# Altium footprint library IDETEC.PcbLib: 275 footprints (part 3 of 18)
Each footprint in its own frame and in the unit in brackets; x right, y up, seen from the top. Pads: shape width x height; smd on the part's side, far side on the other; paste and mask are expansions set on the pad; w line width, h text height; cw(c..) or ccw(c..) is an arc to the next point about the centre after c.
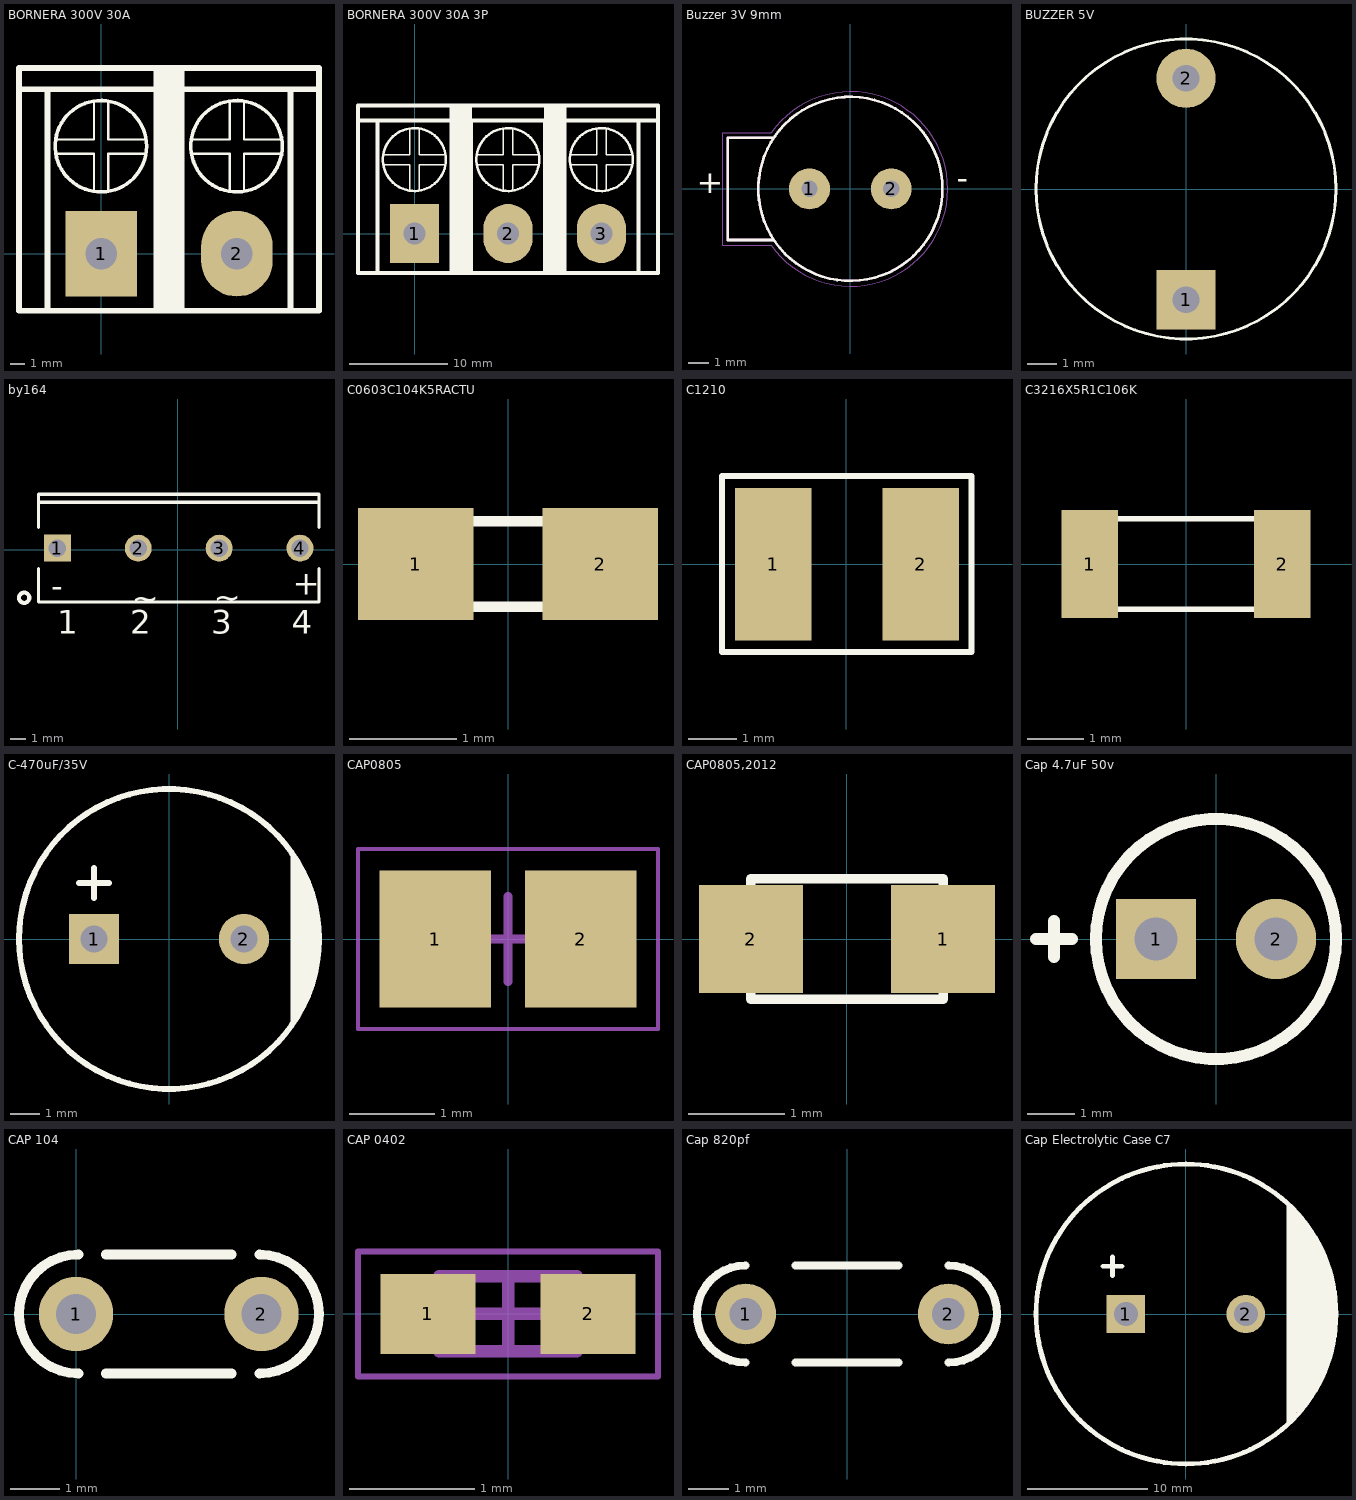
[diagram p2: the footprints below, top view; thin cyan lines are the x and y axes]

## BORNERA 300V 30A [mm] "bornera con tapa naranja"
pads (2):
  rect 5x6 hole 2.2: 1(0,0)
  oval 5x6 hole 2.2: 2(9.5,0)
Top Overlay:
  circle w0.254: c9.48,7.52 r3.2
  circle w0.254: c9.48,7.52 r3.2
  circle w0.254: c-0.02,7.52 r3.2
  lines w0.15: -5.75,-4 -3.75,-4 ; -5.75,11.5 -5.75,13 ; -3.14,6.99 -0.5,6.99 -0.5,4.32 ; -3.14,7.99 -0.5,7.99 -0.5,10.66 ; 0.5,4.32 0.5,6.99 3.14,6.99 ; 0.5,10.66 0.5,7.99 3.14,7.99 ; 3.75,-3.99 3.75,13 ; 5.55,13 4.75,13 3.75,13 ; 5.75,-3.99 5.75,13 3.75,13 ; 6.36,6.99 9,6.99 9,4.32 ; 6.36,7.99 9,7.99 9,10.66 ; 10,4.32 10,6.99 12.64,6.99 ; 10,10.66 10,7.99 12.64,7.99 ; 13.25,-4 15.25,-4
  lines w0.3: 3.93,-3.95 3.93,13.05 ; 4.19,-3.95 4.19,13.05 ; 4.47,-3.95 4.47,13.05 ; 4.75,-3.95 4.75,13.05 ; 5.03,-3.95 5.03,13.05 ; 5.32,-3.95 5.32,13.05 ; 5.55,-3.89 5.55,13
  lines w0.4: -5.75,11.5 15.23,11.5 ; -3.75,-4 -3.75,11.5 ; 13.25,-4 13.25,11.5 ; -5.75,-4 -5.75,13 15.25,13 15.25,-4 -5.75,-4
3D body "User Library-Terminal_Block.STEP": height 18.64, standoff -4.86, extent -6.28,-3.19 15.72,12.31

## BORNERA 300V 30A 3P [mm] "3-Terminal block"
height 2
pads (3):
  rect 5x6 hole 2.2: 1(0,0)
  oval 5x6 hole 2.2: 2(9.5,0) 3(19,0)
Top Overlay:
  circle w0.254: c9.48,7.52 r3.2
  circle w0.254: c9.48,7.52 r3.2
  circle w0.254: c-0.02,7.52 r3.2
  circle w0.254: c9.48,7.52 r3.2
  circle w0.254: c18.98,7.52 r3.2
  circle w0.254: c18.98,7.52 r3.2
  lines w0.15: -5.75,11.5 -5.75,13 ; -3.14,6.99 -0.5,6.99 -0.5,4.32 ; -3.14,7.99 -0.5,7.99 -0.5,10.66 ; 0.5,4.32 0.5,6.99 3.14,6.99 ; 0.5,10.66 0.5,7.99 3.14,7.99 ; 3.75,-4 5.75,-4 ; 3.75,-3.99 3.75,13 ; 3.75,11.5 3.75,13 ; 5.55,13 4.75,13 3.75,13 ; 5.75,-3.99 5.75,13 3.75,13 ; 13.25,-4 15.25,-4 ; 13.25,-3.99 13.25,13 ; 15.05,13 14.25,13 13.25,13 ; 15.25,-3.99 15.25,13 13.25,13 ; 15.86,6.99 18.5,6.99 18.5,4.32 ; 15.86,7.99 18.5,7.99 18.5,10.66 ; 19.5,4.32 19.5,6.99 22.14,6.99 ; 19.5,10.66 19.5,7.99 22.14,7.99 ; 9,6.99 6.36,6.99 9,6.99 ; 9,6.99 9,4.32 9,6.99 ; 9,7.99 6.36,7.99 9,7.99 ; 9,7.99 9,10.66 9,7.99 ; 10,6.99 12.64,6.99 10,6.99 ; 10,6.99 10,4.32 10,6.99 ; 10,7.99 10,10.66 10,7.99 ; 10,7.99 12.64,7.99 10,7.99
  lines w0.3: 3.93,-3.95 3.93,13.05 ; 4.19,-3.95 4.19,13.05 ; 4.47,-3.95 4.47,13.05 ; 4.75,-3.95 4.75,13.05 ; 5.03,-3.95 5.03,13.05 ; 5.32,-3.95 5.32,13.05 ; 5.55,-3.89 5.55,13 ; 13.43,-3.95 13.43,13.05 ; 13.69,-3.95 13.69,13.05 ; 13.97,-3.95 13.97,13.05 ; 14.25,-3.95 14.25,13.05 ; 14.53,-3.95 14.53,13.05 ; 14.82,-3.95 14.82,13.05 ; 15.05,-3.89 15.05,13
  lines w0.4: -5.75,11.5 15.23,11.5 ; -3.75,-4 -3.75,11.5 ; 3.75,-4 3.75,13 ; 3.75,11.5 24.73,11.5 ; 5.75,-4 5.75,11.5 ; 13.25,-4 13.25,11.5 ; 15.05,-4 24.75,-4 24.75,13 3.75,13 ; 15.25,13 15.25,-4 -5.75,-4 -5.75,13 3.75,13 ; 22.75,-4 22.75,11.5
3D body "User Library-Terminal_Block.STEP": height 18.64, standoff -4.86, extent -6.28,-3.19 15.72,12.31
3D body "User Library-Terminal_Block.STEP": height 18.64, standoff -4.86, extent 3.22,-3.19 25.22,12.31

## Buzzer 3V 9mm [mm]
pads (2):
  round 2 hole 0.8: 1(-2,0) 2(2,0)
Top Overlay:
  circle w0.127: c0,0 r4.5
  lines w0.127: -3.75,-2.5 -6,-2.5 -6,2.5 -3.75,2.5
  text "-" at 5.2,-0.4 h1.97
  text "+" at -7.5,-0.6 h1.97
Mechanical 16:
  circle w0.127: c0,0 r4.5
  lines w0.127: -3.75,-2.5 -6,-2.5 -6,2.5 -3.75,2.5
Mechanical 27:
  lines w0.05: -6.25,-2.75 -6.25,2.75 -3.87,2.75 cw(c0.005,-0.007) -3.88,-2.75 -6.25,-2.75
3D body "AT-1127-ST-2-R.STEP": height 4.4, standoff -4.4, extent -5.969,-4.5 4.531,4.5

## BUZZER 5V [mm]
pads (2):
  rect 2x2 hole 0.9: 1(0,-3.75)
  round 2 hole 0.9: 2(0,3.75)
Top Overlay:
  circle w0.1: c0,0 r5.08
3D body "SW3dPS-WST-1203UX.STEP": height 9.65, standoff -4.5, extent -6,-9.479 6,5.975

## by164 [mm]
pads (4):
  rect 1.7x1.7 hole 1.1: 1(-7.579,0.104)
  round 1.7 hole 1.1: 2(-2.479,0.104) 3(2.621,0.104) 4(7.721,0.104)
Top Overlay:
  circle w0.254: c-9.675,-3.025 r0.326
  lines w0.2: -8.779,-1.196 -8.779,-3.296 8.921,-3.296 8.921,-1.196 ; -8.779,1.404 -8.779,3.504 8.921,3.504 8.921,1.404 ; -8.779,3.004 8.921,3.004
  text "1" at -7.579,-5.296 h1.5
  text "2" at -2.987,-5.296 h1.5
  text "3" at 2.113,-5.296 h1.5
  text "4" at 7.213,-5.296 h1.5
  text "-" at -7.975,-3 h1.5
  text "+" at 7.275,-2.85 h1.5
  text "~" at -2.899,-3.796 h1.5
  text "~" at 2.275,-3.725 h1.5
3D body "SW3dPS-bridge 2.STEP": height 20.8, standoff -15.83, extent -11.15,-1.18 11.15,2.58

## C0603C104K5RACTU [mm] "100nF"
pads (2):
  rect 1.08x1.05 smd: 1(-0.865,0) 2(0.865,0)
Top Overlay:
  lines w0.1: -0.8,-0.4 0.8,-0.4 0.8,0.4 -0.8,0.4 -0.8,-0.4
3D body "SW3dPS-0603 SMD Capacitor.STEP": height 0.3, standoff 0, extent -0.793,-0.409 0.807,0.391

## C1210 [mil]
pads (2):
  rect 62x123 smd: 1(-59.06,0) 2(60,0)
Top Overlay:
  lines w5: -100.39,-70.87 101,-70.87 101,71 -100.39,71 -100.39,-70.87
3D body "User Library-cap_1210_lowprofile.STEP": height 51.18, standoff 0, extent -62.99,-49.21 63,49.22

## C3216X5R1C106K [mm] "CAP 10uF 16v"
pads (2):
  rect 1x1.9 smd: 1(-1.7,0) 2(1.7,0)
Top Overlay:
  lines w0.1: -1.6,-0.8 -1.6,0.8 1.6,0.8 1.6,-0.8 -1.6,-0.8
3D body "User Library-CAPC3216X10.STEP": height 1, standoff 0, extent -1.598,-0.797 1.602,0.803

## C-470uF/35V [mm] "C-470uF/35V"
height 12
pads (2):
  rect 1.7x1.7 hole 0.9: 1(-2.54,0)
  round 1.7 hole 0.9: 2(2.54,0)
Top Overlay:
  circle w0.2: c0,0 r5.08
  lines w0.15: 4.19,-2.85 4.19,2.84 ; 4.31,-2.59 4.31,2.55 ; 4.43,-2.41 4.43,2.39 ; 4.58,-2.14 4.58,2.12 ; 4.73,-1.81 4.73,1.77 ; 4.87,-1.28 4.87,1.44 ; 4.94,-0.66 4.94,0.59
  lines w0.2: -3.048,1.9 -2.032,1.9 ; -2.54,1.392 -2.54,2.408
3D body "User Library-CE_R200_D400_H500.STEP": height 13.3, standoff -2.1, extent -5.039,-5.062 5.08,5.063

## CAP0805 [mm] "Chip Capacitor, 2-Leads, Body 2,10x1,35mm, IPC Medium Density"
height 1.25
pads (2):
  rect 1.3x1.6 smd: 1(-0.85,0) 2(0.85,0)
Mechanical 15:
  lines w0.05: -1.75,-1.05 -1.75,1.05 1.75,1.05 1.75,-1.05 -1.75,-1.05
  lines w0.1: -0.5,0 0.5,0 ; 0,-0.5 0,0.5
3D body "User Library-Chip Cap_MLCC_0805 (2012)_D.STEP": height 1.25, standoff 0, extent -1,-0.615 1,0.635

## CAP0805,2012 [mm] "Capacitores cerámicos de capas múltiples (MLCC) - SMD/SMT X5R 0805 20%"
pads (2):
  rect 1.08x1.12 smd: 1(1,0) 2(-1,0)
Top Overlay:
  lines w0.1: -1,-0.625 1,-0.625 1,0.625 -1,0.625 -1,-0.625
3D body "SW3dPS-0603 SMD Capacitor.STEP": height 0.3, standoff 0, extent -0.875,-0.4 0.725,0.4

## Cap 4.7uF 50v [mm] "capacitor 4.7uF 50v"
pads (2):
  rect 1.7x1.7 hole 0.9: 1(-1.27,0)
  round 1.7 hole 0.9: 2(1.27,0)
Top Overlay:
  circle w0.254: c0,0 r2.54
  lines w0.254: -3.81,0 -3.048,0 ; -3.429,-0.381 -3.429,0.381
3D body "User Library-CE_R100_D200_H460.STEP": height 12.7, standoff -2.4, extent -2.54,-2.539 2.538,2.54

## CAP 104 [mm] "capacitor de 100nF"
height 7.5
pads (2):
  round 1.5 hole 0.8: 1(0,0) 2(3.74,0)
Top Overlay:
  lines w0.051: 0,0 0.6,0 ; 3.14,0 3.74,0
  lines w0.2: 0.05,-1.2 cw(c0.05,0) 0.05,1.2 ; 0.6,-1.2 3.14,-1.2 ; 0.6,1.2 3.14,1.2 ; 3.7,-1.2 ccw(c3.7,0) 3.7,1.2
3D body "User Library-Ceramic Capacitor 5x3_75mm.STEP": height 6.46, standoff -2.5, extent -0.559,-0.975 4.359,1.025

## CAP 0402 [mm] "Chip Capacitor, 2-Leads, Body 1,05x0,55mm, IPC Medium Density"
height 0.6
pads (2):
  rect 0.76x0.64 smd: 1(-0.64,0) 2(0.64,0)
Mechanical 13:
  lines w0.1: -0.55,-0.3 -0.55,0.3 0.55,0.3 0.55,-0.3 -0.55,-0.3
Mechanical 15:
  lines w0.05: -1.2,-0.5 -1.2,0.5 1.2,0.5 1.2,-0.5 -1.2,-0.5
  lines w0.1: -0.3,0 0.3,0 ; 0,-0.3 0,0.3
3D body "SW3dPS-0402 SMD Capacitor.STEP": height 0.18, standoff -0.02, extent -0.5,-0.3 0.5,0.3

## Cap 820pf [mm]
height 2
pads (2):
  round 1.5 hole 0.8: 1(-2.5,0) 2(2.5,0)
Top Overlay:
  lines w0.2: -2.5,-1.2 cw(c-2.5,0) -2.5,1.2 ; -1.27,-1.2 1.27,-1.2 ; -1.27,1.2 1.27,1.2 ; 2.5,-1.2 ccw(c2.5,0) 2.5,1.2
3D body "User Library-Cer-Cap2_5 (5x1_5).STEP": height 6, standoff -2, extent -2.894,-1.583 2.892,1.593

## Cap Electrolytic Case C7 [mm] "CAP ALUM 2200UF 20% 100V SNAP"
pads (2):
  rect 3.2x3.2 hole 2: 1(-5,0)
  round 3.2 hole 2: 2(5,0)
Top Overlay:
  circle w0.4: c0.02,0 r12.5
  lines w0.4: -6.893,3.978 -5.315,3.978 ; -6.104,3.189 -6.104,4.767 ; 8.613,-9.067 8.613,9.071 ; 8.995,-8.612 8.995,8.673 ; 9.319,8.246 9.319,-8.026 9.638,-7.707 ; 9.638,7.972 9.638,-7.707 ; 9.993,7.423 9.993,-7.352 9.638,-7.707 ; 10.201,-6.896 10.381,-6.716 10.381,6.933 ; 10.743,-6.359 10.743,6.306 ; 10.754,6.012 11.148,5.618 ; 11.139,-5.635 11.139,5.616 ; 11.321,-4.798 11.54,-4.579 ; 11.539,-4.58 11.539,4.855 ; 11.612,-3.845 11.913,-3.544 11.913,3.67 11.71,3.873 ; 11.857,-2.569 12.226,-2.2 12.226,2.568
3D body "User Library-Aluminum Electrolytic Capacitors 10000uF 50V.STEP": height 41.2, standoff -6.5, extent -21.496,-21.496 21.496,21.496